# Altium footprint library semiconductor.PcbLib: 20 footprints (part 2 of 2)
Each footprint in its own frame and in the unit in brackets; x right, y up, seen from the top. Pads: shape width x height; smd on the part's side, far side on the other; paste and mask are expansions set on the pad; w line width, h text height; cw(c..) or ccw(c..) is an arc to the next point about the centre after c.
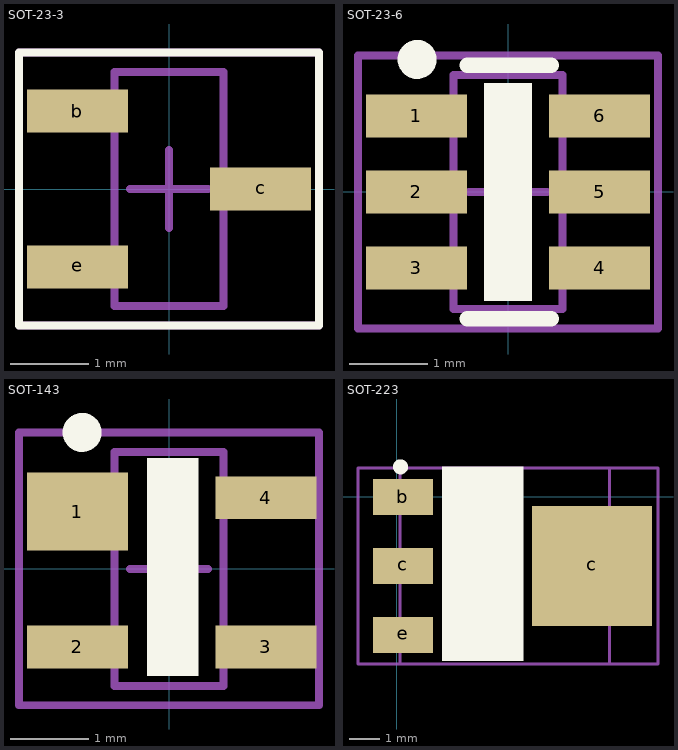
[diagram p1: the footprints below, top view; thin cyan lines are the x and y axes]

## SOT-23-3 [mm]
height 1.1
pads (3):
  rect 1.3x0.55 smd: b(-1.175,1.001) c(1.175,0) e(-1.175,-1.001)
Top Overlay:
  lines w0.1: -1.925,-1.75 -1.925,1.75 1.925,1.75 1.925,-1.7 1.925,-1.75 -1.925,-1.75
Mechanical 13:
  lines w0.1: -0.7,-1.5 -0.7,1.5 0.7,1.5 0.7,-1.5 -0.7,-1.5
Mechanical 15:
  lines w0.1: -0.5,0 0.5,0 ; 0,-0.5 0,0.5 ; -1.925,-1.75 -1.925,1.75 1.925,1.75 1.925,-1.75 -1.925,-1.75
  text ".Designator" at 2.6,0 h1
3D body "SOT-23-3-1.STEP": height 1.1, standoff 0, extent -1.271,-1.5 1.271,1.5

## SOT-23-6 [mm]
height 1.1
pads (6):
  rect 1.3x0.55 smd: 1(-1.175,0.975) 2(-1.175,0) 3(-1.175,-0.975) 4(1.175,-0.975) 5(1.175,0) 6(1.175,0.975)
Top Overlay:
  circle w0.25: c-1.166,1.702 r0.125
  rectangle: -0.305,-1.397 0.305,1.397
  lines w0.2: -0.524,-1.625 0.555,-1.625 ; -0.524,1.625 0.555,1.625
Mechanical 13:
  lines w0.1: -0.7,-1.5 0.7,-1.5 0.7,1.5 -0.7,1.5 -0.7,-1.5
Mechanical 15:
  lines w0.1: -0.5,0 0.5,0 ; 0,-0.5 0,0.5 ; -1.925,-1.75 1.925,-1.75 1.925,1.75 -1.925,1.75 -1.925,-1.75
3D body "SOT-23-6.step": height 1.09, standoff 0, extent -1.213,-1.4 1.213,1.394

## SOT-143 [mm]
height 1.1
pads (4):
  rect 1.3x1 smd: 1(-1.175,0.737)
  rect 1.3x0.55 smd: 2(-1.175,-1.001) 3(1.245,-1.001) 4(1.245,0.914)
Top Overlay:
  circle w0.25: c-1.116,1.753 r0.125
  rectangle: -0.279,-1.372 0.381,1.422
Mechanical 13:
  lines w0.1: -0.7,-1.5 -0.7,1.5 0.7,1.5 0.7,-1.5 -0.7,-1.5
Mechanical 15:
  lines w0.1: -0.5,0 0.5,0 ; 0,-0.5 0,0.5 ; -1.925,-1.75 -1.925,1.75 1.925,1.75 1.925,-1.75 -1.925,-1.75
3D body "SOT143.step": height 1, standoff 0, extent -1.108,-1.499 1.312,1.421

## SOT-223 [mm]
height 1.1
pads (4):
  rect 2x1.2 smd: b(0.2,0) c(0.2,-2.3) e(0.2,-4.6)
  rect 4x4 smd: c(6.5,-2.3)
Top Overlay:
  circle w0.25: c0.12,1 r0.125
  rectangle: 1.499,-5.464 4.216,1.013
Mechanical 13:
  lines w0.1: 0.102,-5.565 0.102,0.963 7.087,0.963 7.087,-5.565 0.102,-5.565
Mechanical 15:
  lines w0.1: 3.1,-2.25 4.1,-2.25 ; 3.6,-2.75 3.6,-1.75 ; -1.295,-5.565 -1.295,0.963 8.7,0.963 8.7,-5.565 -1.295,-5.565
3D body "SOT-223.step": height 1.7, standoff 0.02, extent 0.12,-5.5 7.08,1